# Altium footprint library Remote.PcbLib: 47 footprints (part 1 of 3)
Each footprint in its own frame and in the unit in brackets; x right, y up, seen from the top. Pads: shape width x height; smd on the part's side, far side on the other; paste and mask are expansions set on the pad; w line width, h text height; cw(c..) or ccw(c..) is an arc to the next point about the centre after c.
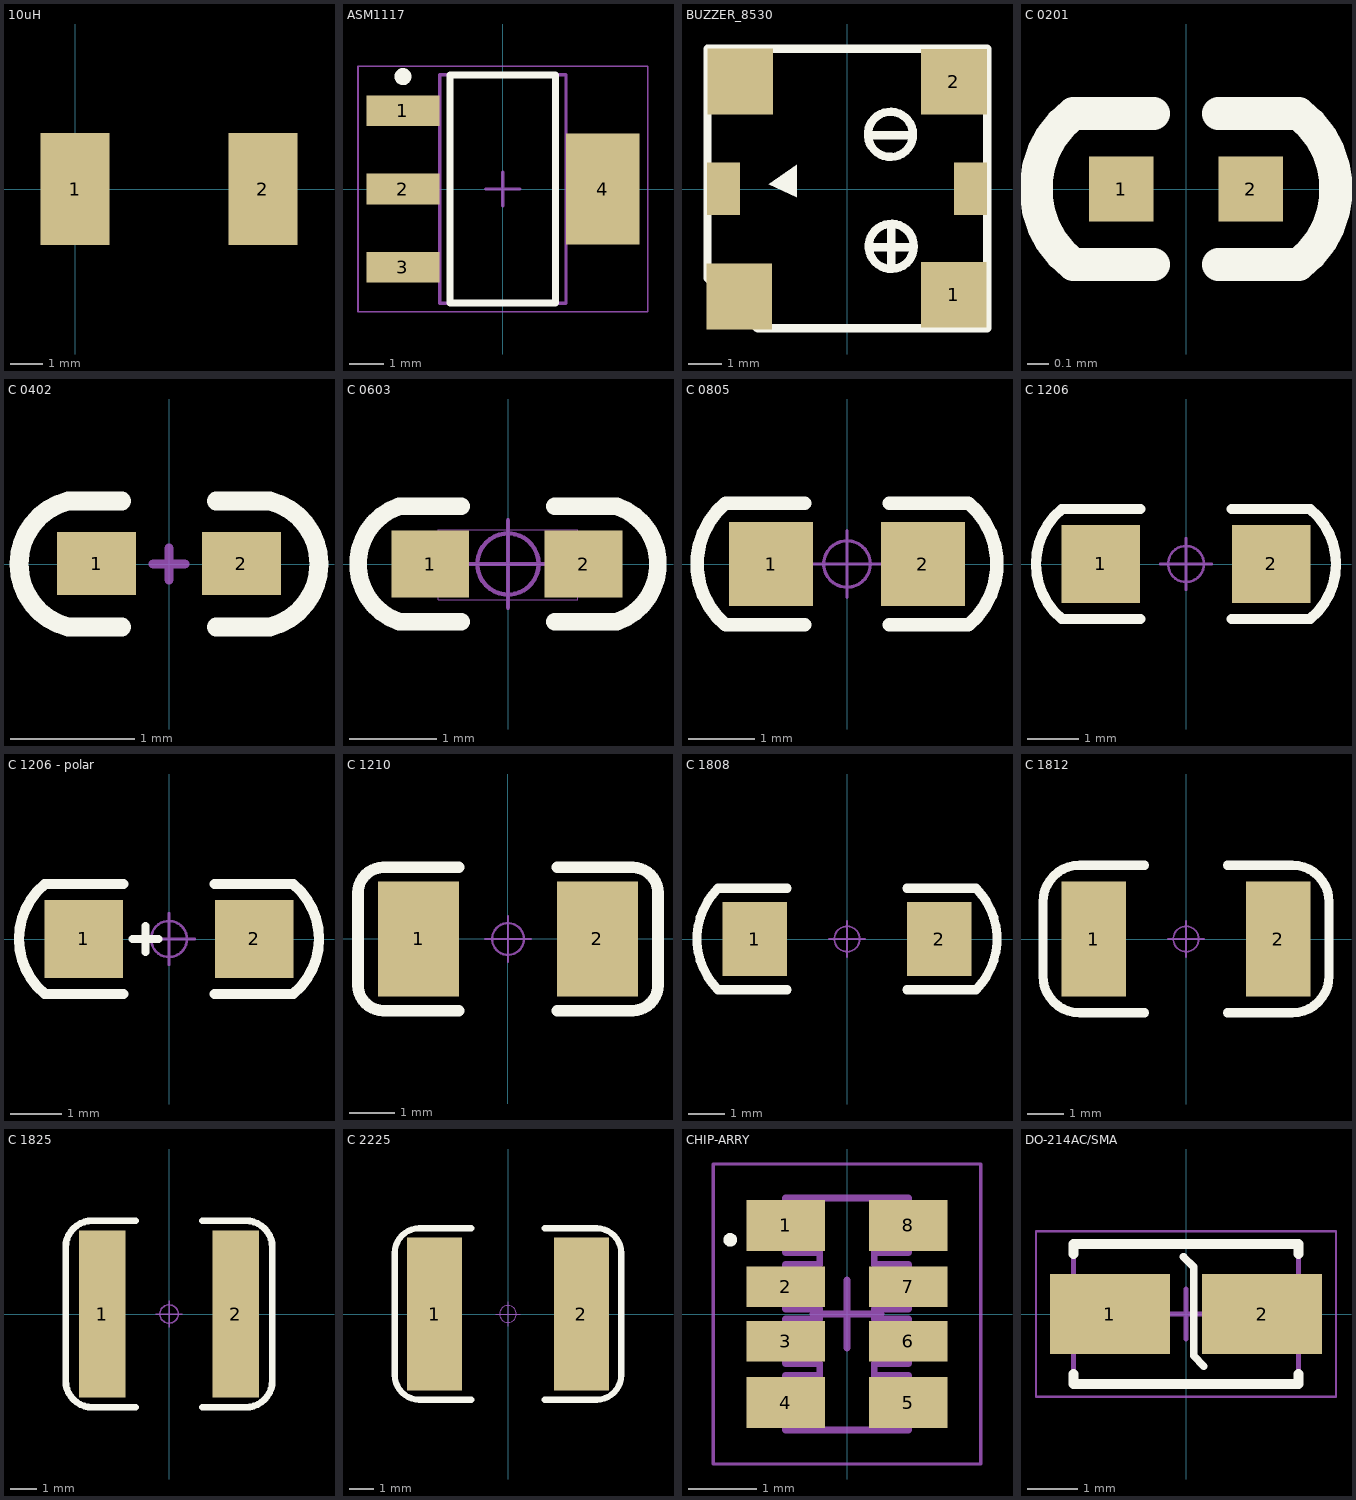
[diagram p0: the footprints below, top view; thin cyan lines are the x and y axes]

## 10uH [mm] "一体成型电感0630封装"
pads (2):
  rect 2.15x3.5 smd: 1(0,0) 2(5.85,0)
3D body: height 0.25, standoff 0, extent -0.725,-3.3 6.575,3.3

## ASM1117 [mm] "SOT223, 4-Leads, Body 6.51x7.00mm (avg), Pitch 2.30mm, IPC Medium Density"
height 1.8
pads (4):
  rect 2.15x0.9 smd: 1(-2.93,2.3) 2(-2.93,0) 3(-2.93,-2.3)
  rect 2.15x3.25 smd: 4(2.93,0)
Top Overlay:
  circle w0.25: c-2.93,3.3 r0.125
  lines w0.2: -1.55,-3.35 1.55,-3.35 1.55,3.35 -1.55,3.35 -1.55,-3.35
Top Assembly:
  lines w0.1: -1.855,-3.355 1.855,-3.355 1.855,3.355 -1.855,3.355 -1.855,-3.355
Top Courtyard:
  lines w0.05: -4.25,-3.6 4.25,-3.6 4.25,3.6 -4.25,3.6 -4.25,-3.6
  lines w0.1: -0.5,0 0.5,0 ; 0,-0.5 0,0.5
3D body: height 1.8, standoff 0.64, extent -1.855,-3.355 1.855,3.355

## BUZZER_8530 [mm]
pads (6):
  rect 2x2 smd: 1(3.242,-3.217) 2(3.251,3.26) ""(-3.277,-3.267) ""(-3.242,3.267)
  rect 1x1.6 smd: ""(-3.759,0.009) ""(3.759,0.009)
Top Overlay:
  circle w0.254: c1.321,1.66 r0.686
  circle w0.254: c1.346,-1.743 r0.686
  region: -2.38,0.144 -1.524,0.743 -1.524,-0.255
  lines w0.254: 0.686,-1.769 2.032,-1.769 ; 0.806,1.635 2.007,1.635 ; 1.346,-2.429 1.346,-1.083 ; -4.242,-2.709 -4.242,4.267 4.258,4.267 4.258,-4.233 -2.718,-4.233 -4.242,-2.709
3D body: height 0.25, standoff 0, extent -4.242,-4.233 4.258,4.267

## C 0201 [mm] "无极性贴片电容"
pads (2):
  rect 0.3x0.3 smd: 1(-0.3,0) 2(0.3,0)
Top Overlay:
  lines w0.152: -0.15,-0.35 -0.523,-0.35 cw(c-0.254,0) -0.523,0.35 -0.15,0.35 ; 0.15,-0.35 0.523,-0.35 ccw(c0.254,0) 0.523,0.35 0.15,0.35
3D body "C 0201.STEP": height 0.31, standoff -0.01, extent -0.3,-0.16 0.3,0.16

## C 0402 [mil] "无极性贴片电容"
pads (2):
  rect 25x20 smd: 1(-23,0.16) 2(23,0.16)
Top Overlay:
  lines w6: -15,-20 -32,-20 cw(c-27,0) -32,20.01 -15,20 ; 15,-20 32,-20 ccw(c27,0) 32,20.01 15,20
Mechanical 15:
  lines w3: -5,0 5,0 ; 0,-5 0,5
3D body "C 0402.STEP": height 20.08, standoff -0.39, extent -19.69,-10.24 19.69,10.24

## C 0603 [mil] "无极性贴片电容"
pads (2):
  rect 35x30 smd: 1(-35,0) 2(34,0)
Top Overlay:
  lines w7.87: -21,-26 -49.02,-26 cw(c-40,0) -49.02,26 -21,26 ; 21,-26 49.02,-26 ccw(c40,0) 49.02,26 21,26
Mechanical 13:
  lines w0.39: -31.5,-16 -31.5,15.5 31.5,15.5 31.5,-16 -31.5,-16
Mechanical 15:
  circle w1.97: c0,0 r13.78
  lines w1.97: -19.68,0 19.68,0 ; 0,-19.68 0,19.68
3D body "C 0603.STEP": height 31.89, standoff -0.39, extent -31.5,-16.14 31.5,16.14

## C 0805 [mil] "无极性贴片电容"
height 19.68
pads (2):
  rect 50x50 smd: 1(-45,0) 2(45,0)
Top Overlay:
  lines w7.87: -25,-36 -72,-36 cw(c-42,0) -72,36 -25,36 ; 25,-36 72,-36 ccw(c42,0) 72,36 25,36
Mechanical 15:
  circle w1.97: c0,0 r13.78
  lines w1.97: -19.68,0 19.68,0 ; 0,-19.68 0,19.68
3D body "C 0805.STEP": height 20.08, standoff -0.39, extent -39.37,-24.02 39.37,24.02

## C 1206 [mil] "无极性贴片电容"
pads (2):
  rect 60x60 smd: 1(-65,0) 2(65,0)
Top Overlay:
  lines w7.87: -35,-42 -95,-42 cw(c-60,0) -95,42 -35,42 ; 35,-42 95,-42 ccw(c60,0) 95,42 35,42
Mechanical 15:
  circle w1.97: c0,0 r13.78
  lines w1.97: -19.68,0 19.68,0 ; 0,-19.68 0,19.68
3D body "C 1206.STEP": height 47.64, standoff -0.39, extent -62.99,-31.89 62.99,31.89

## C 1206 - polar [mil] "钽电容"
pads (2):
  rect 60x60 smd: 1(-65,0) 2(65,0)
Top Overlay:
  lines w6: -28,0 -8,0 ; -18,-10 -18,1 -18,10
  lines w7.87: -35,-42 -95,-42 cw(c-60,0) -95,42 -35,42 ; 35,-42 95,-42 ccw(c60,0) 95,42 35,42
Mechanical 15:
  circle w1.97: c0,0 r13.78
  lines w1.97: -19.68,0 19.68,0 ; 0,-19.68 0,19.68
3D body "C 1206.STEP": height 47.64, standoff -0.39, extent -62.99,-31.89 62.99,31.89

## C 1210 [mil] "无极性贴片电容"
pads (2):
  rect 70x100 smd: 1(-77.5,0) 2(77.5,0)
Top Overlay:
  lines w10: -42.5,-62 -108.06,-62 cw(c-108.06,-40.06) -130,-40.06 -130,40.06 cw(c-108.06,40.06) -108.06,62 -42.5,62 ; 42.5,-62 108.06,-62 ccw(c108.06,-40.06) 130,-40.06 130,40.06 ccw(c108.06,40.06) 108.06,62 42.5,62
Mechanical 15:
  circle w1.97: c0,0 r13.78
  lines w1.97: -19.68,0 19.68,0 ; 0,-19.68 0,19.68
3D body "C 1210.STEP": height 60.43, standoff 0.2, extent -62.99,-50.59 62.99,50.59

## C 1808 [mil] "无极性贴片电容"
pads (2):
  rect 70x80 smd: 1(-100,0) 2(100,0)
Top Overlay:
  lines w9.84: -140,-55 cw(c-85,0) -140,55 ; 140,-55 ccw(c85,0) 140,55
  lines w10: -140,-55 -65,-55 ; -140,55 -65,55 ; 65,-55 140,-55 ; 65,55 140,55
Mechanical 15:
  circle w1.97: c0,0 r13.78
  lines w1.97: -19.68,0 19.68,0 ; 0,-19.68 0,19.68
3D body "C 1808.STEP": height 59.45, standoff -0.39, extent -90.55,-39.76 90.55,39.76

## C 1812 [mil] "无极性贴片电容"
pads (2):
  rect 70x125 smd: 1(-100,0) 2(100,0)
Top Overlay:
  lines w10: -45,-80 -115,-80 cw(c-115,-40) -155,-40 -155,40 cw(c-115,40) -115,80 -45,80 ; 45,-80 115,-80 ccw(c115,-40) 155,-40 155,40 ccw(c115,40) 115,80 45,80
Mechanical 15:
  circle w1.97: c0,0 r13.78
  lines w1.97: -19.68,0 19.68,0 ; 0,-19.68 0,19.68
3D body "C 1812.STEP": height 79.13, standoff -0.39, extent -90.55,-63.39 90.55,63.39

## C 1825 [mil] "无极性贴片电容"
pads (2):
  rect 70x250 smd: 1(-100,0) 2(100,0)
Top Overlay:
  lines w10: -50,-140 -115,-140 cw(c-115,-100) -155,-100 -155,100 cw(c-115,100) -115,140 -50,140 ; 50,-140 115,-140 ccw(c115,-100) 155,-100 155,100 ccw(c115,100) 115,140 50,140
Mechanical 15:
  circle w1.97: c0,0 r13.78
  lines w1.97: -19.68,0 19.68,0 ; 0,-19.68 0,19.68
3D body "C 1825.STEP": height 63.39, standoff -0.39, extent -88.58,-125.4 88.58,125.4

## C 2225 [mil] "无极性贴片电容"
pads (2):
  rect 90x250 smd: 1(-120,0) 2(120,0)
Top Overlay:
  lines w10: -60,-140 -145,-140 cw(c-145,-100) -185,-100 -185,100 cw(c-145,100) -145,140 -60,140 ; 60,-140 145,-140 ccw(c145,-100) 185,-100 185,100 ccw(c145,100) 145,140 60,140
Mechanical 15:
  circle w1.97: c0,0 r13.78
  lines w1.97: -19.68,0 19.68,0 ; 0,-19.68 0,19.68
3D body "C 2225.STEP": height 63.39, standoff -0.39, extent -110.24,-125.4 110.24,125.4

## CHIP-ARRY [mm] "Chip Array, ConvexS, 8-Leads, Pitch 0.80mm,  Body 3.20x1.60mm,  IPC Low Density"
height 0.5
pads (8):
  rect 1.15x0.75 smd: 1(-0.9,1.3) 4(-0.9,-1.3) 5(0.9,-1.3) 8(0.9,1.3)
  rect 1.15x0.6 smd: 2(-0.9,0.4) 3(-0.9,-0.4) 6(0.9,-0.4) 7(0.9,0.4)
Top Overlay:
  circle w0.1: c-1.712,1.088 r0.05
Top Assembly:
  lines w0.1: -0.9,-1.7 0.9,-1.7 0.9,-0.9 0.4,-0.9 0.4,-0.725 0.9,-0.725 0.9,-0.075 0.4,-0.075 0.4,0.075 0.9,0.075 0.9,0.725 0.4,0.725 0.4,0.9 0.9,0.9 0.9,1.7 -0.9,1.7 -0.9,0.9 -0.4,0.9 -0.4,0.725 -0.9,0.725 -0.9,0.075 -0.4,0.075 -0.4,-0.075 -0.9,-0.075 -0.9,-0.725 -0.4,-0.725 -0.4,-0.9 -0.9,-0.9 -0.9,-1.7
Top Courtyard:
  lines w0.05: -1.96,-2.2 1.96,-2.2 1.96,2.2 -1.96,2.2 -1.96,-2.2
  lines w0.1: -0.5,0 0.5,0 ; 0,-0.5 0,0.5
3D body: height 0.5, standoff 0, extent -0.9,-1.7 0.9,1.7

## DO-214AC/SMA [mm] "SS54"
height 2.42
pads (2):
  rect 2.4x1.6 smd: 1(-1.525,0) 2(1.525,0)
Top Overlay:
  lines w0.152: -0.051,1.143 0.152,0.94 0.152,-0.838 0.356,-1.041
  lines w0.2: -2.25,-1.2 -2.25,-1.4 2.25,-1.4 2.25,-1.2 ; -2.25,1.2 -2.25,1.4 2.25,1.4 2.25,1.2
Top Assembly:
  lines w0.1: -2.25,-1.4 -2.25,1.4 2.25,1.4 2.25,-1.4 -2.25,-1.4
Top Courtyard:
  lines w0.05: -3,-1.65 -3,1.65 3,1.65 3,-1.65 -3,-1.65
  lines w0.1: -0.5,0 0.5,0 ; 0,-0.5 0,0.5
3D body: height 2.42, standoff 0, extent -2.25,-1.4 2.25,1.4